# Altium footprint library cool_library.PcbLib: 1182 footprints (part 50 of 75)
Each footprint in its own frame and in the unit in brackets; x right, y up, seen from the top. Pads: shape width x height; smd on the part's side, far side on the other; paste and mask are expansions set on the pad; w line width, h text height; cw(c..) or ccw(c..) is an arc to the next point about the centre after c.
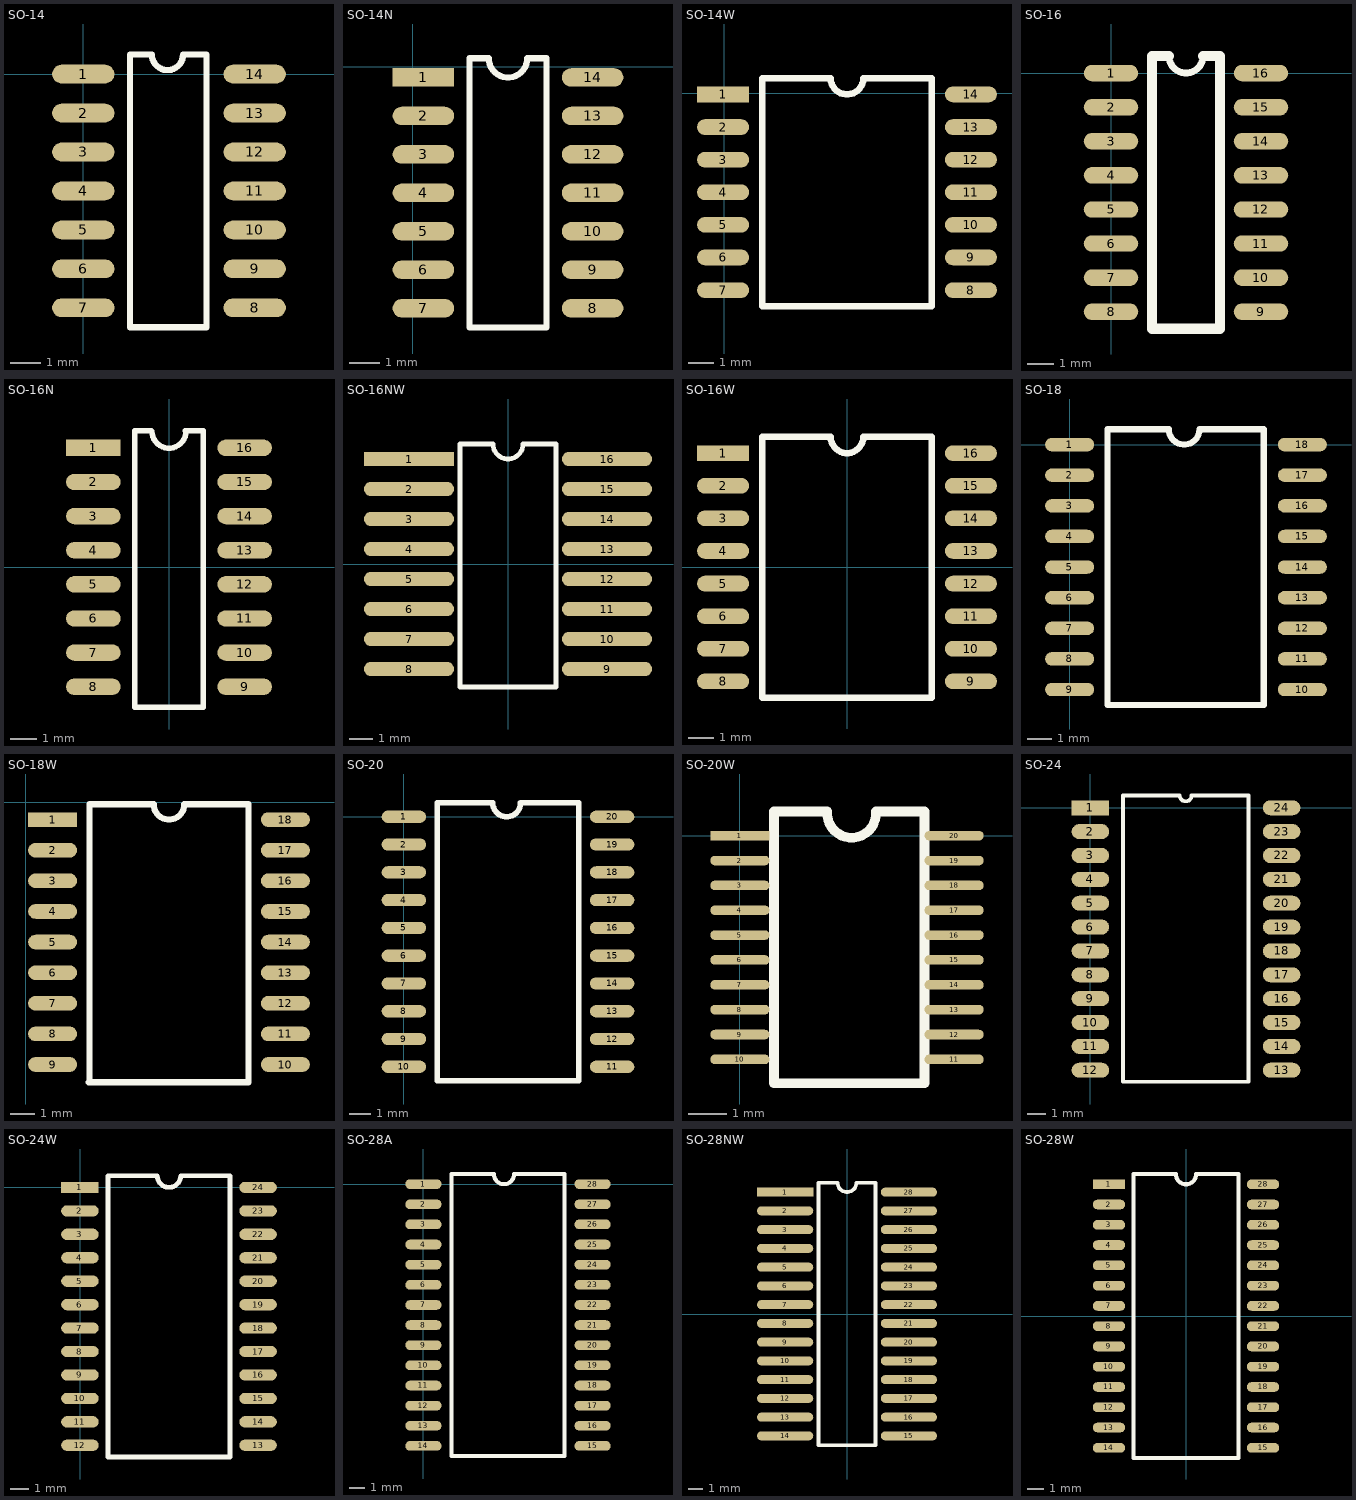
[diagram p49: the footprints below, top view; thin cyan lines are the x and y axes]

## SO-14 [mil]
pads (14):
  oval 80x24 smd: 1(0,0) 2(0,-50) 3(0,-100) 4(0,-150) 5(0,-200) 6(0,-250) 7(0,-300) 8(220,-300) 9(220,-250) 10(220,-200) 11(220,-150) 12(220,-100) 13(220,-50) 14(220,0)
Top Overlay:
  lines w8: 60,-325 158,-325 158,25 128,25 cw(c108,25) 88,25 60,25 60,-325

## SO-14N [mil]
pads (14):
  rect 80x24 smd: 1(14,-14)
  oval 80x24 smd: 2(14,-64) 3(14,-114) 4(14,-164) 5(14,-214) 6(14,-264) 7(14,-314) 8(234,-314) 9(234,-264) 10(234,-214) 11(234,-164) 12(234,-114) 13(234,-64) 14(234,-14)
Top Overlay:
  lines w8: 74,-339 174,-339 174,11 149,11 cw(c124,11) 99,11 74,11 74,-339

## SO-14W [mil]
pads (14):
  rect 80x24 smd: 1(-2,-2)
  oval 80x24 smd: 2(-2,-52) 3(-2,-102) 4(-2,-152) 5(-2,-202) 6(-2,-252) 7(-2,-302) 8(378,-302) 9(378,-252) 10(378,-202) 11(378,-152) 12(378,-102) 13(378,-52) 14(378,-2)
Top Overlay:
  lines w10: 58,-327 58,23 163,23 ccw(c188,23) 213,23 318,23 318,-327 58,-327

## SO-16 [mil]
pads (16):
  oval 80x24 smd: 1(0,0) 2(0,-50) 3(0,-100) 4(0,-150) 5(0,-200) 6(0,-250) 7(0,-300) 8(0,-350) 9(220,-350) 10(220,-300) 11(220,-250) 12(220,-200) 13(220,-150) 14(220,-100) 15(220,-50) 16(220,0)
Top Overlay:
  lines w10: 85,25 ccw(c110,25) 135,25
  lines w15: 85,25 60,25 60,-375 160,-375 160,25 135,25

## SO-16N [mil]
pads (16):
  rect 80x24 smd: 1(-110.95,175)
  oval 80x24 smd: 2(-110.95,125) 3(-110.95,75) 4(-110.95,25) 5(-110.95,-25) 6(-110.95,-75) 7(-110.95,-125) 8(-110.95,-175) 9(110.95,-175) 10(110.95,-125) 11(110.95,-75) 12(110.95,-25) 13(110.95,25) 14(110.95,75) 15(110.95,125) 16(110.95,175)
Top Overlay:
  lines w8: -50.05,199.62 -50.05,-205 49.95,-205 49.95,199.62 ; -50.05,200 -25.95,200 ; -25.05,199.62 ccw(c-0.05,199.62) 24.95,199.62 ; 24.05,200 49.95,200

## SO-16NW [mil]
height 590.55
pads (16):
  rect 150x24 smd: 1(-165,175)
  oval 150x24 smd: 2(-165,125) 3(-165,75) 4(-165,25) 5(-165,-25) 6(-165,-75) 7(-165,-125) 8(-165,-175) 9(165,-175) 10(165,-125) 11(165,-75) 12(165,-25) 13(165,25) 14(165,75) 15(165,125) 16(165,175)
Top Overlay:
  lines w8: -80,-205 -80,200 -25,200 ccw(c0,200) 25,200 80,200 80,-205 -80,-205

## SO-16W [mil]
pads (16):
  rect 80x24 smd: 1(-190,175)
  oval 80x24 smd: 2(-190,125) 3(-190,75) 4(-190,25) 5(-190,-25) 6(-190,-75) 7(-190,-125) 8(-190,-175) 9(190,-175) 10(190,-125) 11(190,-75) 12(190,-25) 13(190,25) 14(190,75) 15(190,125) 16(190,175)
Top Overlay:
  lines w10: -25.28,200 -130,200 -130,-200 130,-200 130,200 25,200 cw(c0,200) -25,200

## SO-18 [mil]
pads (18):
  oval 80x22 smd: 1(0,0) 2(0,-50) 3(0,-100) 4(0,-150) 5(0,-200) 6(0,-250) 7(0,-300) 8(0,-350) 9(0,-400) 10(380,-400) 11(380,-350) 12(380,-300) 13(380,-250) 14(380,-200) 15(380,-150) 16(380,-100) 17(380,-50) 18(380,0)
Top Overlay:
  lines w10: 62,-425 62,25 162,25 ccw(c187,25) 212,25 317,25 317,-425 62,-425

## SO-18W [mil]
pads (18):
  rect 80x24 smd: 1(44,-28)
  oval 80x24 smd: 2(44,-78) 3(44,-128) 4(44,-178) 5(44,-228) 6(44,-278) 7(44,-328) 8(44,-378) 9(44,-428) 10(424,-428) 11(424,-378) 12(424,-328) 13(424,-278) 14(424,-228) 15(424,-178) 16(424,-128) 17(424,-78) 18(424,-28)
Top Overlay:
  lines w10: 103,-457 363,-457 ; 104,-457 104,-3 209,-3 ccw(c234,-3) 259,-3 364,-3 364,-457

## SO-20 [mil]
pads (20):
  oval 80x22 smd: 1(0,0) 2(0,-50) 3(0,-100) 4(0,-150) 5(0,-200) 6(0,-250) 7(0,-300) 8(0,-350) 9(0,-400) 10(0,-450) 11(375,-450) 12(375,-400) 13(375,-350) 14(375,-300) 15(375,-250) 16(375,-200) 17(375,-150) 18(375,-100) 19(375,-50) 20(375,0)
Top Overlay:
  lines w10: 60,-475 315,-475 315,25 210,25 cw(c185,25) 160,25 60,25 60,-475

## SO-20W [mm]
pads (20):
  rect 1.55x0.25 smd: 1(0,0)
  oval 1.55x0.25 smd: 2(0,-0.65) 3(0,-1.3) 4(0,-1.95) 5(0,-2.6) 6(0,-3.25) 7(0,-3.9) 8(0,-4.55) 9(0,-5.2) 10(0,-5.85) 11(5.6,-5.85) 12(5.6,-5.2) 13(5.6,-4.55) 14(5.6,-3.9) 15(5.6,-3.25) 16(5.6,-2.6) 17(5.6,-1.95) 18(5.6,-1.3) 19(5.6,-0.65) 20(5.6,0)
Top Overlay:
  lines w0.254: 0.889,-6.477 4.826,-6.477 4.826,0.635 3.556,0.635 cw(c2.921,0.584) 2.286,0.635 0.889,0.635 0.889,-6.477

## SO-24 [mm]
pads (24):
  rect 2x0.8 smd: 1(0,0)
  oval 2x0.8 smd: 2(0,-1.27) 3(0,-2.54) 4(0,-3.81) 5(0,-5.08) 6(0,-6.35) 7(0,-7.62) 8(0,-8.89) 9(0,-10.16) 10(0,-11.43) 11(0,-12.7) 12(0,-13.97) 13(10.172,-13.97) 14(10.172,-12.7) 15(10.172,-11.43) 16(10.172,-10.16) 17(10.172,-8.89) 18(10.172,-7.62) 19(10.172,-6.35) 20(10.172,-5.08) 21(10.172,-3.81) 22(10.172,-2.54) 23(10.172,-1.27) 24(10.172,0)
Top Overlay:
  lines w0.2: 1.727,-14.58 8.407,-14.58 8.407,0.66 5.385,0.66 cw(c5.067,0.66) 4.75,0.66 1.727,0.66 1.727,-14.58

## SO-24W [mil]
pads (24):
  rect 80x24 smd: 1(-1,0)
  oval 80x24 smd: 2(-1,-50) 3(-1,-100) 4(-1,-150) 5(-1,-200) 6(-1,-250) 7(-1,-300) 8(-1,-350) 9(-1,-400) 10(-1,-450) 11(-1,-500) 12(-1,-550) 13(379,-550) 14(379,-500) 15(379,-450) 16(379,-400) 17(379,-350) 18(379,-300) 19(379,-250) 20(379,-200) 21(379,-150) 22(379,-100) 23(379,-50) 24(379,0)
Top Overlay:
  lines w10: 59,-575 319,-575 319,25 214,25 cw(c189,25) 164,25 59,25 59,-575

## SO-28A [mil]
pads (28):
  oval 90x24 smd: 1(0,0) 2(0,-50) 3(0,-100) 4(0,-150) 5(0,-200) 6(0,-250) 7(0,-300) 8(0,-350) 9(0,-400) 10(0,-450) 11(0,-500) 12(0,-550) 13(0,-600) 14(0,-650) 15(420,-650) 16(420,-600) 17(420,-550) 18(420,-500) 19(420,-450) 20(420,-400) 21(420,-350) 22(420,-300) 23(420,-250) 24(420,-200) 25(420,-150) 26(420,-100) 27(420,-50) 28(420,0)
Top Overlay:
  lines w10: 70,-675 350,-675 350,25 225,25 cw(c200,25) 175,25 70,25 70,-675

## SO-28NW [mil]
height 590.55
pads (28):
  rect 150x24 smd: 1(-165,325)
  oval 150x24 smd: 2(-165,275) 3(-165,225) 4(-165,175) 5(-165,125) 6(-165,75) 7(-165,25) 8(-165,-25) 9(-165,-75) 10(-165,-125) 11(-165,-175) 12(-165,-225) 13(-165,-275) 14(-165,-325) 15(165,-325) 16(165,-275) 17(165,-225) 18(165,-175) 19(165,-125) 20(165,-75) 21(165,-25) 22(165,25) 23(165,75) 24(165,125) 25(165,175) 26(165,225) 27(165,275) 28(165,325)
Top Overlay:
  lines w10: -76.3,350 -76.3,-350 76.3,-350 76.3,350 25,350 cw(c0,350) -25,350 -75,350

## SO-28W [mil]
pads (28):
  rect 80x24 smd: 1(-190,325)
  oval 80x24 smd: 2(-190,275) 3(-190,225) 4(-190,175) 5(-190,125) 6(-190,75) 7(-190,25) 8(-190,-25) 9(-190,-75) 10(-190,-125) 11(-190,-175) 12(-190,-225) 13(-190,-275) 14(-190,-325) 15(190,-325) 16(190,-275) 17(190,-225) 18(190,-175) 19(190,-125) 20(190,-75) 21(190,-25) 22(190,25) 23(190,75) 24(190,125) 25(190,175) 26(190,225) 27(190,275) 28(190,325)
Top Overlay:
  lines w10: -130,-350 130,-350 130,350 25,350 cw(c0,350) -25,350 -130,350 -130,-350